# Altium footprint library Molex FFC - FPC Connectors (SMT).PcbLib: 638 footprints (part 37 of 40)
Each footprint in its own frame and in the unit in brackets; x right, y up, seen from the top. Pads: shape width x height; smd on the part's side, far side on the other; paste and mask are expansions set on the pad; w line width, h text height; cw(c..) or ccw(c..) is an arc to the next point about the centre after c.
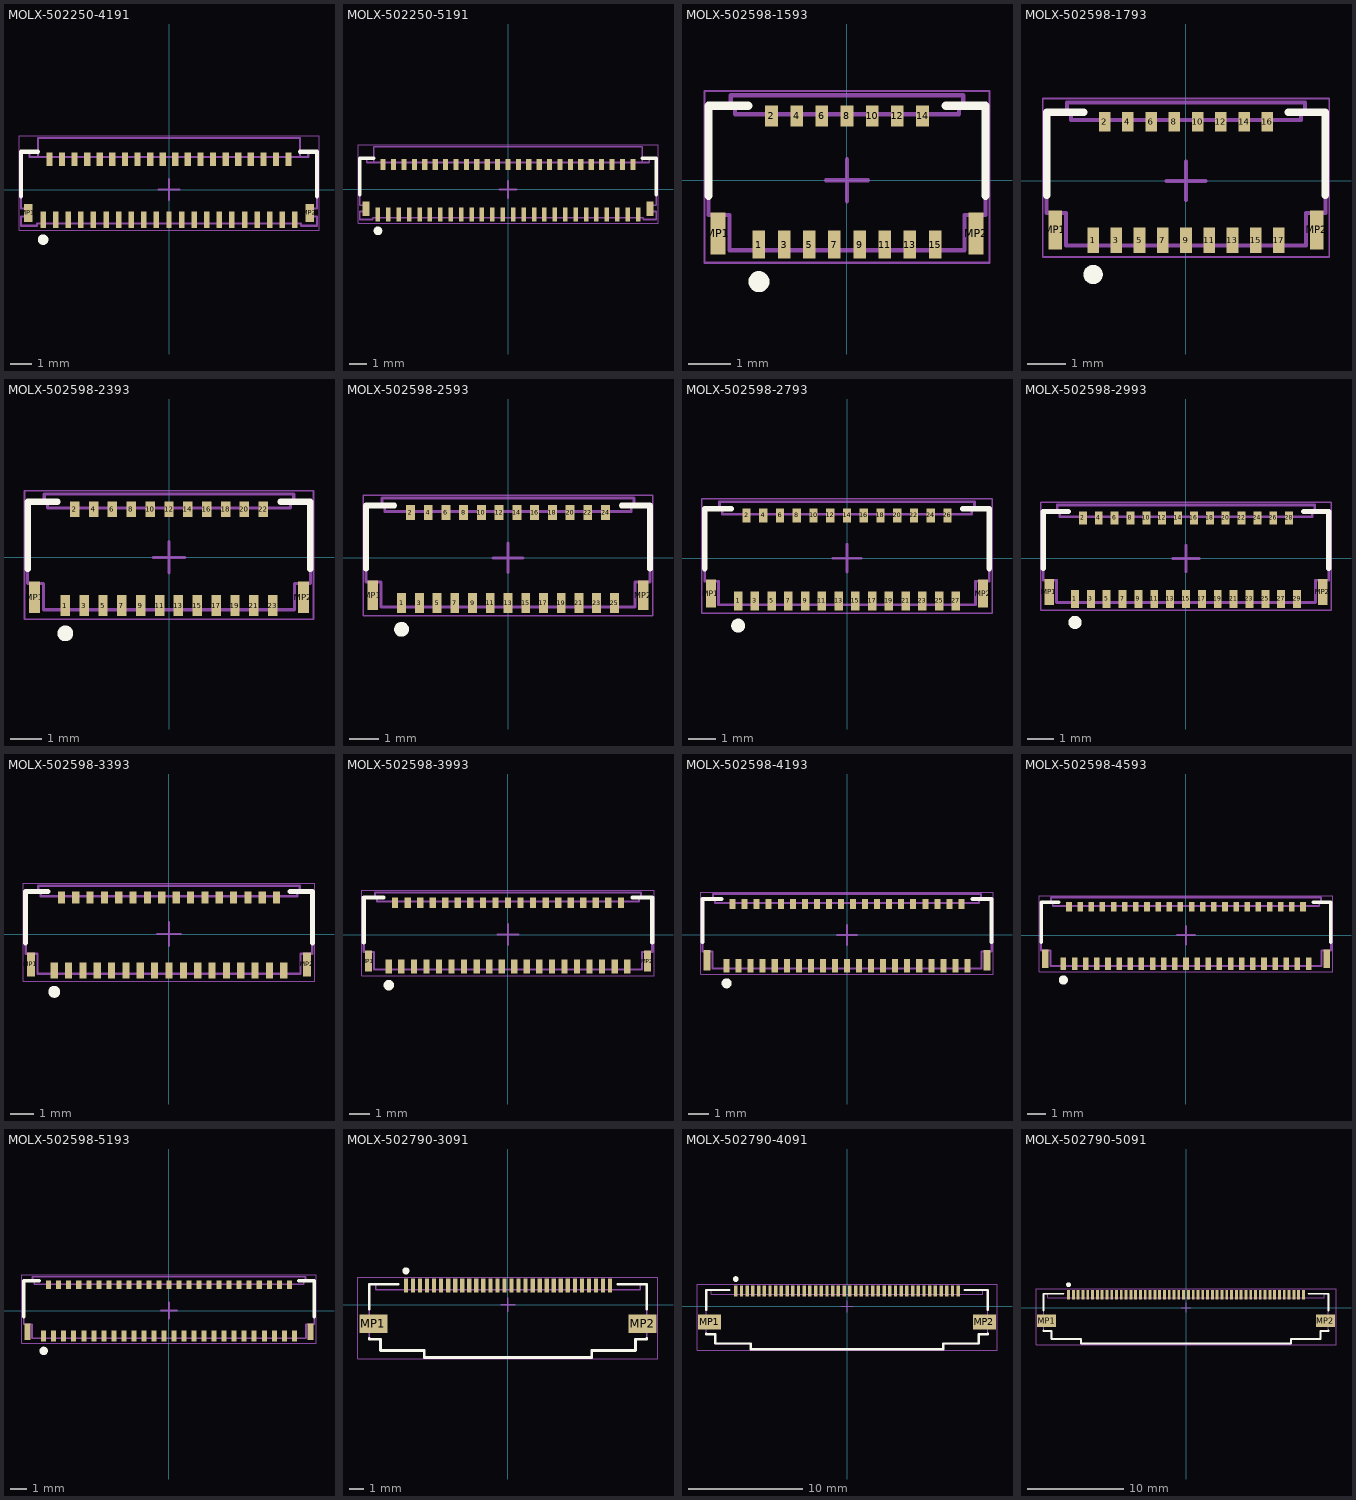
[diagram p36: the footprints below, top view; thin cyan lines are the x and y axes]

## MOLX-502250-4191 [mm] "FPC Connector, 41-Leads, Right Angle, Pitch 0.3 mm, Mated Height 0.9 mm, SMT"
height 0.912
pads (43):
  rect 0.26x0.8 smd: 1(-6,-1.438) 3(-5.4,-1.438) 5(-4.8,-1.438) 7(-4.2,-1.438) 9(-3.6,-1.438) 11(-3,-1.438) 13(-2.4,-1.438) 15(-1.8,-1.438) 17(-1.2,-1.438) 19(-0.6,-1.438) 21(0,-1.438) 23(0.6,-1.438) 25(1.2,-1.438) 27(1.8,-1.438) 29(2.4,-1.438) 31(3,-1.438) 33(3.6,-1.438) 35(4.2,-1.438) 37(4.8,-1.438) 39(5.4,-1.438) 41(6,-1.438)
  rect 0.3x0.65 smd: 2(-5.7,1.438) 4(-5.1,1.438) 6(-4.5,1.438) 8(-3.9,1.438) 10(-3.3,1.438) 12(-2.7,1.438) 14(-2.1,1.438) 16(-1.5,1.438) 18(-0.9,1.438) 20(-0.3,1.438) 22(0.3,1.438) 24(0.9,1.438) 26(1.5,1.438) 28(2.1,1.438) 30(2.7,1.438) 32(3.3,1.438) 34(3.9,1.438) 36(4.5,1.438) 38(5.1,1.438) 40(5.7,1.438)
  rect 0.4x0.85 smd: MP1(-6.7,-1.112) MP2(6.7,-1.112)
Top Overlay:
  circle w0.25: c-6,-2.388 r0.125
  lines w0.2: -7.05,-0.317 -7.05,1.803 -6.248,1.803 ; 6.248,1.803 7.05,1.803 7.05,-0.317
Mechanical 13:
  lines w0.1: -6.24,1.56 -6.24,2.463 ; -6.24,1.803 -6.24,2.463 ; -4.2,-1.627 4.2,-1.627 ; -6.3,-1.727 -6.3,-1.727 ; -6.3,-1.727 -6.3,-1.627 6.3,-1.627 6.3,-1.727 7.05,-1.727 7.05,-1.277 6.77,-1.277 6.77,-0.912 7.05,-0.912 7.05,1.803 6.749,1.803 6.75,1.74 6.639,1.74 6.64,1.56 6.24,1.56 ; -6.3,-1.727 -7.05,-1.727 -7.05,-1.277 -6.77,-1.277 -6.77,-0.912 -7.05,-0.912 -7.05,1.803 -6.75,1.803 -6.75,1.74 -6.64,1.74 -6.64,1.56 6.24,1.56 ; -6.24,2.463 6.24,2.463 6.24,1.56
Mechanical 15:
  lines w0.05: -7.15,-1.937 -7.15,2.563 7.15,2.563 7.15,-1.937 -7.15,-1.937
  lines w0.1: -0.5,0 0.5,0 ; 0,-0.5 0,0.5
3D body: height 0.25, standoff 0, extent -7.05,-1.727 7.05,2.463

## MOLX-502250-5191 [mm] "FPC Connector, 51-Leads, Right Angle, Pitch 0.3 mm, Mated Height 0.9 mm, SMT"
height 0.912
pads (53):
  rect 0.26x0.8 smd: 1(-7.5,-1.437) 3(-6.9,-1.437) 5(-6.3,-1.437) 7(-5.7,-1.437) 9(-5.1,-1.437) 11(-4.5,-1.437) 13(-3.9,-1.437) 15(-3.3,-1.437) 17(-2.7,-1.437) 19(-2.1,-1.437) 21(-1.5,-1.437) 23(-0.9,-1.437) 25(-0.3,-1.437) 27(0.3,-1.437) 29(0.9,-1.437) 31(1.5,-1.437) 33(2.1,-1.437) 35(2.7,-1.437) 37(3.3,-1.437) 39(3.9,-1.437) 41(4.5,-1.437) 43(5.1,-1.437) 45(5.7,-1.437) 47(6.3,-1.437) 49(6.9,-1.437) 51(7.5,-1.437)
  rect 0.3x0.65 smd: 2(-7.2,1.438) 4(-6.6,1.438) 6(-6,1.438) 8(-5.4,1.438) 10(-4.8,1.438) 12(-4.2,1.438) 14(-3.6,1.438) 16(-3,1.438) 18(-2.4,1.438) 20(-1.8,1.438) 22(-1.2,1.438) 24(-0.6,1.438) 26(0,1.438) 28(0.6,1.438) 30(1.2,1.438) 32(1.8,1.438) 34(2.4,1.438) 36(3,1.438) 38(3.6,1.438) 40(4.2,1.438) 42(4.8,1.438) 44(5.4,1.438) 46(6,1.438) 48(6.6,1.438) 50(7.2,1.438)
  rect 0.4x0.85 smd: MP1(-8.2,-1.112) MP2(8.2,-1.112)
Top Overlay:
  circle w0.25: c-7.5,-2.387 r0.125
  lines w0.2: -8.55,-0.317 -8.55,1.803 -7.748,1.803 ; 7.748,1.803 8.55,1.803 8.55,-0.316
Mechanical 13:
  lines w0.1: -8.14,1.739 -8.14,1.56 7.74,1.559 ; -8.14,1.74 -8.25,1.74 -8.25,1.803 -8.55,1.803 -8.55,-0.912 -8.26,-0.912 -8.26,-1.277 -8.55,-1.277 -8.55,-1.727 -7.8,-1.727 -7.8,-1.628 7.8,-1.628 7.8,-1.727 8.55,-1.727 8.55,-1.277 8.26,-1.277 8.26,-0.912 8.55,-0.912 8.55,1.803 8.249,1.803 8.25,1.74 8.139,1.74 ; -7.74,1.803 -7.74,2.463 7.74,2.463 7.74,1.559 ; -7.74,1.559 -7.74,2.463 ; 8.14,1.739 8.14,1.56 7.74,1.559
Mechanical 15:
  lines w0.05: -8.65,-1.937 -8.65,2.563 8.65,2.563 8.65,-1.937 -8.65,-1.937
  lines w0.1: -0.5,0 0.5,0 ; 0,-0.5 0,0.5
3D body: height 0.25, standoff 0, extent -8.55,-1.727 8.55,2.463

## MOLX-502598-1593 [mm] "FPC Connector, 15-Leads, Right Angle, Pitch 0.3 mm, Mated Height 1.15 mm, SMT"
height 1.162
pads (17):
  rect 0.3x0.67 smd: 1(-2.1,-1.532) 3(-1.5,-1.532) 5(-0.9,-1.532) 7(-0.3,-1.532) 9(0.3,-1.532) 11(0.9,-1.532) 13(1.5,-1.532) 15(2.1,-1.532)
  rect 0.3x0.5 smd: 2(-1.8,1.533) 4(-1.2,1.533) 6(-0.6,1.533) 8(0,1.533) 10(0.6,1.533) 12(1.2,1.533) 14(1.8,1.533)
  rect 0.35x1 smd: MP1(-3.075,-1.267) MP2(3.075,-1.267)
Top Overlay:
  circle w0.25: c-2.1,-2.417 r0.125
  lines w0.2: -3.3,-0.371 -3.3,1.775 -2.35,1.775 ; 2.35,1.775 3.3,1.775 3.3,-0.371
Mechanical 13:
  lines w0.1: -2.77,1.775 -2.77,2.025 2.77,2.025 2.77,1.775 ; -3.3,-0.825 -3.3,1.775 -2.67,1.775 -2.67,1.575 2.67,1.575 2.67,1.775 3.3,1.775 3.3,-0.825 2.8,-0.825 2.8,-1.667 -2.8,-1.667 -2.8,-0.825 -3.3,-0.825
Mechanical 15:
  lines w0.05: -3.4,-1.967 3.4,-1.967 3.4,2.125 -3.4,2.125 -3.4,-1.967
  lines w0.1: -0.5,0 0.5,0 ; 0,-0.5 0,0.5
3D body: height 0.25, standoff 0, extent -3.3,-1.775 3.3,2.025

## MOLX-502598-1793 [mm] "FPC Connector, 17-Leads, Right Angle, Pitch 0.3 mm, Mated Height 1.15 mm, SMT"
height 1.162
pads (19):
  rect 0.3x0.67 smd: 1(-2.4,-1.532) 3(-1.8,-1.532) 5(-1.2,-1.532) 7(-0.6,-1.532) 9(0,-1.532) 11(0.6,-1.532) 13(1.2,-1.532) 15(1.8,-1.532) 17(2.4,-1.532)
  rect 0.3x0.5 smd: 2(-2.1,1.533) 4(-1.5,1.533) 6(-0.9,1.533) 8(-0.3,1.533) 10(0.3,1.533) 12(0.9,1.533) 14(1.5,1.533) 16(2.1,1.533)
  rect 0.35x1 smd: MP1(-3.375,-1.267) MP2(3.375,-1.267)
Top Overlay:
  circle w0.25: c-2.4,-2.417 r0.125
  lines w0.2: -3.6,-0.371 -3.6,1.775 -2.65,1.775 ; 2.65,1.775 3.6,1.775 3.6,-0.371
Mechanical 13:
  lines w0.1: -3.1,-1.667 3.1,-1.667 ; -3.1,-1.667 -3.1,-0.825 -3.6,-0.825 -3.6,1.775 -2.97,1.775 -2.97,1.575 2.97,1.575 2.97,1.775 3.6,1.775 3.6,-0.825 3.1,-0.825 3.1,-1.667 ; -3.07,1.775 -3.07,2.025 3.07,2.025 3.07,1.775
Mechanical 15:
  lines w0.05: -3.7,-1.967 -3.7,2.125 3.7,2.125 3.7,-1.967 -3.7,-1.967
  lines w0.1: -0.5,0 0.5,0 ; 0,-0.5 0,0.5
3D body: height 0.25, standoff 0, extent -3.6,-1.775 3.6,2.025

## MOLX-502598-2393 [mm] "FPC Connector, 23-Leads, Right Angle, Pitch 0.3 mm, Mated Height 1.15 mm, SMT"
height 1.162
pads (25):
  rect 0.3x0.67 smd: 1(-3.3,-1.532) 3(-2.7,-1.532) 5(-2.1,-1.532) 7(-1.5,-1.532) 9(-0.9,-1.532) 11(-0.3,-1.532) 13(0.3,-1.532) 15(0.9,-1.532) 17(1.5,-1.532) 19(2.1,-1.532) 21(2.7,-1.532) 23(3.3,-1.532)
  rect 0.3x0.5 smd: 2(-3,1.533) 4(-2.4,1.533) 6(-1.8,1.533) 8(-1.2,1.533) 10(-0.6,1.533) 12(0,1.533) 14(0.6,1.533) 16(1.2,1.533) 18(1.8,1.533) 20(2.4,1.533) 22(3,1.533)
  rect 0.35x1 smd: MP1(-4.275,-1.267) MP2(4.275,-1.267)
Top Overlay:
  circle w0.25: c-3.3,-2.417 r0.125
  lines w0.2: -4.5,-0.37 -4.5,1.775 -3.55,1.775 ; 3.55,1.775 4.5,1.775 4.5,-0.37
Mechanical 13:
  lines w0.1: -3.97,1.775 -3.97,2.025 3.97,2.025 3.97,1.775 ; -4.5,-0.825 -4,-0.825 -4,-1.667 4,-1.667 4,-0.825 4.5,-0.825 4.5,1.775 3.87,1.775 3.87,1.575 -3.87,1.575 -3.87,1.775 -4.5,1.775 -4.5,-0.825
Mechanical 15:
  lines w0.05: -4.6,-1.967 4.6,-1.967 4.6,2.125 -4.6,2.125 -4.6,-1.967
  lines w0.1: -0.5,0 0.5,0 ; 0,-0.5 0,0.5
3D body: height 0.25, standoff 0, extent -4.5,-1.775 4.5,2.025

## MOLX-502598-2593 [mm] "FPC Connector, 25-Leads, Right Angle, Pitch 0.3 mm, Mated Height 1.15 mm, SMT"
height 1.162
pads (27):
  rect 0.3x0.67 smd: 1(-3.6,-1.532) 3(-3,-1.532) 5(-2.4,-1.532) 7(-1.8,-1.532) 9(-1.2,-1.532) 11(-0.6,-1.532) 13(0,-1.532) 15(0.6,-1.532) 17(1.2,-1.532) 19(1.8,-1.532) 21(2.4,-1.532) 23(3,-1.532) 25(3.6,-1.532)
  rect 0.3x0.5 smd: 2(-3.3,1.533) 4(-2.7,1.533) 6(-2.1,1.533) 8(-1.5,1.533) 10(-0.9,1.533) 12(-0.3,1.533) 14(0.3,1.533) 16(0.9,1.533) 18(1.5,1.533) 20(2.1,1.533) 22(2.7,1.533) 24(3.3,1.533)
  rect 0.35x1 smd: MP1(-4.575,-1.267) MP2(4.575,-1.267)
Top Overlay:
  circle w0.25: c-3.6,-2.417 r0.125
  lines w0.2: -4.8,-0.37 -4.8,1.775 -3.85,1.775 ; 3.85,1.775 4.8,1.775 4.8,-0.37
Mechanical 13:
  lines w0.1: -4.27,1.775 -4.27,2.025 4.27,2.025 4.27,1.77 ; -4.17,1.775 -4.17,1.575 4.17,1.575 4.17,1.775 4.8,1.775 ; -4.17,1.775 -4.8,1.775 -4.8,-0.825 -4.3,-0.825 -4.3,-1.667 4.3,-1.667 4.3,-0.825 4.8,-0.825 ; 4.8,-0.825 4.8,1.75 ; -4.275,1.775 -4.27,1.78 -4.275,1.775
Mechanical 15:
  lines w0.05: -4.9,-1.967 -4.9,2.125 4.9,2.125 4.9,-1.967 -4.9,-1.967
  lines w0.1: -0.5,0 0.5,0 ; 0,-0.5 0,0.5
3D body: height 0.25, standoff 0, extent -4.8,-1.775 4.8,2.025

## MOLX-502598-2793 [mm] "FPC Connector, 27-Leads, Right Angle, Pitch 0.3 mm, Mated Height 1.15 mm, SMT"
height 1.162
pads (29):
  rect 0.3x0.67 smd: 1(-3.9,-1.532) 3(-3.3,-1.532) 5(-2.7,-1.532) 7(-2.1,-1.532) 9(-1.5,-1.532) 11(-0.9,-1.532) 13(-0.3,-1.532) 15(0.3,-1.532) 17(0.9,-1.532) 19(1.5,-1.532) 21(2.1,-1.532) 23(2.7,-1.532) 25(3.3,-1.532) 27(3.9,-1.532)
  rect 0.3x0.5 smd: 2(-3.6,1.533) 4(-3,1.533) 6(-2.4,1.533) 8(-1.8,1.533) 10(-1.2,1.533) 12(-0.6,1.533) 14(0,1.533) 16(0.6,1.533) 18(1.2,1.533) 20(1.8,1.533) 22(2.4,1.533) 24(3,1.533) 26(3.6,1.533)
  rect 0.35x1 smd: MP1(-4.875,-1.267) MP2(4.875,-1.267)
Top Overlay:
  circle w0.25: c-3.9,-2.417 r0.125
  lines w0.2: -5.1,-0.37 -5.1,1.775 -4.15,1.775 ; 4.15,1.775 5.1,1.775 5.1,-0.37
Mechanical 13:
  lines w0.1: -4.57,1.775 -4.57,2.025 4.57,2.025 4.57,1.775 ; -5.1,-0.825 -4.6,-0.825 -4.6,-1.667 4.6,-1.667 4.6,-0.825 5.1,-0.825 5.1,1.775 4.47,1.775 4.47,1.575 -4.47,1.575 -4.47,1.775 -5.1,1.775 -5.1,-0.825 ; -4.575,1.775 -4.575,1.775
Mechanical 15:
  lines w0.05: -5.2,-1.967 -5.2,2.125 5.2,2.125 5.2,-1.967 -5.2,-1.967
  lines w0.1: -0.5,0 0.5,0 ; 0,-0.5 0,0.5
3D body: height 0.25, standoff 0, extent -5.1,-1.775 5.1,2.025

## MOLX-502598-2993 [mm] "FPC Connector, 29-Leads, Right Angle, Pitch 0.3 mm, Mated Height 1.15 mm, SMT"
height 1.162
pads (31):
  rect 0.3x0.67 smd: 1(-4.2,-1.532) 3(-3.6,-1.532) 5(-3,-1.532) 7(-2.4,-1.532) 9(-1.8,-1.532) 11(-1.2,-1.532) 13(-0.6,-1.532) 15(0,-1.532) 17(0.6,-1.532) 19(1.2,-1.532) 21(1.8,-1.532) 23(2.4,-1.532) 25(3,-1.532) 27(3.6,-1.532) 29(4.2,-1.532)
  rect 0.3x0.5 smd: 2(-3.9,1.533) 4(-3.3,1.533) 6(-2.7,1.533) 8(-2.1,1.533) 10(-1.5,1.533) 12(-0.9,1.533) 14(-0.3,1.533) 16(0.3,1.533) 18(0.9,1.533) 20(1.5,1.533) 22(2.1,1.533) 24(2.7,1.533) 26(3.3,1.533) 28(3.9,1.533)
  rect 0.35x1 smd: MP1(-5.175,-1.267) MP2(5.175,-1.267)
Top Overlay:
  circle w0.25: c-4.2,-2.417 r0.125
  lines w0.2: -5.4,-0.37 -5.4,1.775 -4.45,1.775 ; 4.45,1.775 5.4,1.775 5.4,-0.37
Mechanical 13:
  lines w0.1: -4.87,1.775 -4.87,2.025 4.87,2.025 4.87,1.775 ; 4.77,1.775 5.4,1.775 ; 4.77,1.775 4.77,1.575 -4.77,1.575 -4.77,1.775 -5.4,1.775 -5.4,-0.825 -4.9,-0.825 -4.9,-1.667 4.9,-1.667 4.9,-0.825 5.4,-0.825 5.4,1.775
Mechanical 15:
  lines w0.05: -5.5,-1.967 5.5,-1.967 5.5,2.125 -5.5,2.125 -5.5,-1.967
  lines w0.1: -0.5,0 0.5,0 ; 0,-0.5 0,0.5
3D body: height 0.25, standoff 0, extent -5.4,-1.774 5.4,2.026

## MOLX-502598-3393 [mm] "FPC Connector, 33-Leads, Right Angle, Pitch 0.3 mm, Mated Height 1.15 mm, SMT"
height 1.162
pads (35):
  rect 0.3x0.67 smd: 1(-4.8,-1.532) 3(-4.2,-1.532) 5(-3.6,-1.532) 7(-3,-1.532) 9(-2.4,-1.532) 11(-1.8,-1.532) 13(-1.2,-1.532) 15(-0.6,-1.532) 17(0,-1.532) 19(0.6,-1.532) 21(1.2,-1.532) 23(1.8,-1.532) 25(2.4,-1.532) 27(3,-1.532) 29(3.6,-1.532) 31(4.2,-1.532) 33(4.8,-1.532)
  rect 0.3x0.5 smd: 2(-4.5,1.533) 4(-3.9,1.533) 6(-3.3,1.533) 8(-2.7,1.533) 10(-2.1,1.533) 12(-1.5,1.533) 14(-0.9,1.533) 16(-0.3,1.533) 18(0.3,1.533) 20(0.9,1.533) 22(1.5,1.533) 24(2.1,1.533) 26(2.7,1.533) 28(3.3,1.533) 30(3.9,1.533) 32(4.5,1.533)
  rect 0.35x1 smd: MP1(-5.775,-1.267) MP2(5.775,-1.267)
Top Overlay:
  circle w0.25: c-4.8,-2.417 r0.125
  lines w0.2: -6,-0.37 -6,1.775 -5.05,1.775 ; 5.05,1.775 6,1.775 6,-0.37
Mechanical 13:
  lines w0.1: -5.47,1.775 -5.47,2.025 5.47,2.025 5.47,1.775 ; -6,-0.825 -5.5,-0.825 -5.5,-1.667 5.5,-1.667 5.5,-0.825 6,-0.825 6,1.775 5.37,1.775 5.37,1.575 -5.37,1.575 -5.37,1.775 -6,1.775 -6,-0.825
Mechanical 15:
  lines w0.05: -6.1,-1.967 6.1,-1.967 6.1,2.125 -6.1,2.125 -6.1,-1.967
  lines w0.1: -0.5,0 0.5,0 ; 0,-0.5 0,0.5
3D body: height 0.25, standoff 0, extent -6,-1.775 6,2.025

## MOLX-502598-3993 [mm] "FPC Connector, 39-Leads, Right Angle, Pitch 0.3 mm, Mated Height 1.15 mm, SMT"
height 1.162
pads (41):
  rect 0.3x0.67 smd: 1(-5.7,-1.532) 3(-5.1,-1.532) 5(-4.5,-1.532) 7(-3.9,-1.532) 9(-3.3,-1.532) 11(-2.7,-1.532) 13(-2.1,-1.532) 15(-1.5,-1.532) 17(-0.9,-1.532) 19(-0.3,-1.532) 21(0.3,-1.532) 23(0.9,-1.532) 25(1.5,-1.532) 27(2.1,-1.532) 29(2.7,-1.532) 31(3.3,-1.532) 33(3.9,-1.532) 35(4.5,-1.532) 37(5.1,-1.532) 39(5.7,-1.532)
  rect 0.3x0.5 smd: 2(-5.4,1.533) 4(-4.8,1.533) 6(-4.2,1.533) 8(-3.6,1.533) 10(-3,1.533) 12(-2.4,1.533) 14(-1.8,1.533) 16(-1.2,1.533) 18(-0.6,1.533) 20(0,1.533) 22(0.6,1.533) 24(1.2,1.533) 26(1.8,1.533) 28(2.4,1.533) 30(3,1.533) 32(3.6,1.533) 34(4.2,1.533) 36(4.8,1.533) 38(5.4,1.533)
  rect 0.35x1 smd: MP1(-6.675,-1.267) MP2(6.675,-1.267)
Top Overlay:
  circle w0.25: c-5.7,-2.417 r0.125
  lines w0.2: -6.9,-0.37 -6.9,1.775 -5.95,1.775 ; 5.95,1.775 6.9,1.775 6.9,-0.37
Mechanical 13:
  lines w0.1: -6.37,1.775 -6.37,2.025 6.37,2.025 6.37,1.775 ; 6.27,1.775 6.9,1.775 ; 6.27,1.775 6.27,1.575 -6.27,1.575 -6.27,1.775 -6.9,1.775 -6.9,-0.825 -6.4,-0.825 -6.4,-1.667 6.4,-1.667 6.4,-0.825 6.9,-0.825 6.9,1.775
Mechanical 15:
  lines w0.05: -7,-1.967 7,-1.967 7,2.125 -7,2.125 -7,-1.967
  lines w0.1: -0.5,0 0.5,0 ; 0,-0.5 0,0.5
3D body: height 0.25, standoff 0, extent -6.9,-1.775 6.9,2.025

## MOLX-502598-4193 [mm] "FPC Connector, 41-Leads, Right Angle, Pitch 0.3 mm, Mated Height 1.15 mm, SMT"
height 1.162
pads (43):
  rect 0.3x0.67 smd: 1(-6,-1.532) 3(-5.4,-1.532) 5(-4.8,-1.532) 7(-4.2,-1.532) 9(-3.6,-1.532) 11(-3,-1.532) 13(-2.4,-1.532) 15(-1.8,-1.532) 17(-1.2,-1.532) 19(-0.6,-1.532) 21(0,-1.532) 23(0.6,-1.532) 25(1.2,-1.532) 27(1.8,-1.532) 29(2.4,-1.532) 31(3,-1.532) 33(3.6,-1.532) 35(4.2,-1.532) 37(4.8,-1.532) 39(5.4,-1.532) 41(6,-1.532)
  rect 0.3x0.5 smd: 2(-5.7,1.533) 4(-5.1,1.533) 6(-4.5,1.533) 8(-3.9,1.533) 10(-3.3,1.533) 12(-2.7,1.533) 14(-2.1,1.533) 16(-1.5,1.533) 18(-0.9,1.533) 20(-0.3,1.533) 22(0.3,1.533) 24(0.9,1.533) 26(1.5,1.533) 28(2.1,1.533) 30(2.7,1.533) 32(3.3,1.533) 34(3.9,1.533) 36(4.5,1.533) 38(5.1,1.533) 40(5.7,1.533)
  rect 0.35x1 smd: MP1(-6.975,-1.267) MP2(6.975,-1.267)
Top Overlay:
  circle w0.25: c-6,-2.417 r0.125
  lines w0.2: -7.2,-0.37 -7.2,1.775 -6.25,1.775 ; 6.25,1.775 7.2,1.775 7.2,-0.37
Mechanical 13:
  lines w0.1: -6.67,1.775 -6.67,2.025 6.67,2.025 6.67,1.775 ; -7.2,-0.825 -6.7,-0.825 -6.7,-1.667 6.7,-1.667 6.7,-0.825 7.2,-0.825 7.2,1.775 6.57,1.775 6.57,1.575 -6.57,1.575 -6.57,1.775 -7.2,1.775 -7.2,-0.825
Mechanical 15:
  lines w0.05: -7.3,-1.967 -7.3,2.125 7.3,2.125 7.3,-1.967 -7.3,-1.967
  lines w0.1: -0.5,0 0.5,0 ; 0,-0.5 0,0.5
3D body: height 0.25, standoff 0, extent -7.2,-1.775 7.2,2.025

## MOLX-502598-4593 [mm] "FPC Connector, 45-Leads, Right Angle, Pitch 0.3 mm, Mated Height 1.15 mm, SMT"
height 1.162
pads (47):
  rect 0.3x0.67 smd: 1(-6.6,-1.532) 3(-6,-1.532) 5(-5.4,-1.532) 7(-4.8,-1.532) 9(-4.2,-1.532) 11(-3.6,-1.532) 13(-3,-1.532) 15(-2.4,-1.532) 17(-1.8,-1.532) 19(-1.2,-1.532) 21(-0.6,-1.532) 23(0,-1.532) 25(0.6,-1.532) 27(1.2,-1.532) 29(1.8,-1.532) 31(2.4,-1.532) 33(3,-1.532) 35(3.6,-1.532) 37(4.2,-1.532) 39(4.8,-1.532) 41(5.4,-1.532) 43(6,-1.532) 45(6.6,-1.532)
  rect 0.3x0.5 smd: 2(-6.3,1.533) 4(-5.7,1.533) 6(-5.1,1.533) 8(-4.5,1.533) 10(-3.9,1.533) 12(-3.3,1.533) 14(-2.7,1.533) 16(-2.1,1.533) 18(-1.5,1.533) 20(-0.9,1.533) 22(-0.3,1.533) 24(0.3,1.533) 26(0.9,1.533) 28(1.5,1.533) 30(2.1,1.533) 32(2.7,1.533) 34(3.3,1.533) 36(3.9,1.533) 38(4.5,1.533) 40(5.1,1.533) 42(5.7,1.533) 44(6.3,1.533)
  rect 0.35x1 smd: MP1(-7.575,-1.267) MP2(7.575,-1.267)
Top Overlay:
  circle w0.25: c-6.6,-2.417 r0.125
  lines w0.2: -7.8,-0.37 -7.8,1.775 -6.85,1.775 ; 6.85,1.775 7.8,1.775 7.8,-0.37
Mechanical 13:
  lines w0.1: -7.27,1.775 -7.27,2.025 7.27,2.025 7.27,1.775 ; -7.8,-0.825 -7.8,1.775 -7.17,1.775 -7.17,1.575 7.17,1.575 7.17,1.775 7.8,1.775 7.8,-0.825 7.3,-0.825 7.3,-1.667 -7.3,-1.667 -7.3,-0.825 -7.8,-0.825
Mechanical 15:
  lines w0.05: -7.9,-1.967 -7.9,2.125 7.9,2.125 7.9,-1.967 -7.9,-1.967
  lines w0.1: -0.5,0 0.5,0 ; 0,-0.5 0,0.5
3D body: height 0.25, standoff 0, extent -7.8,-1.775 7.8,2.025

## MOLX-502598-5193 [mm] "FPC Connector, 51-Leads, Right Angle, Pitch 0.3 mm, Mated Height 1.15 mm, SMT"
height 1.162
pads (53):
  rect 0.3x0.67 smd: 1(-7.5,-1.532) 3(-6.9,-1.532) 5(-6.3,-1.532) 7(-5.7,-1.532) 9(-5.1,-1.532) 11(-4.5,-1.532) 13(-3.9,-1.532) 15(-3.3,-1.532) 17(-2.7,-1.532) 19(-2.1,-1.532) 21(-1.5,-1.532) 23(-0.9,-1.532) 25(-0.3,-1.532) 27(0.3,-1.532) 29(0.9,-1.532) 31(1.5,-1.532) 33(2.1,-1.532) 35(2.7,-1.532) 37(3.3,-1.532) 39(3.9,-1.532) 41(4.5,-1.532) 43(5.1,-1.532) 45(5.7,-1.532) 47(6.3,-1.532) 49(6.9,-1.532) 51(7.5,-1.532)
  rect 0.3x0.5 smd: 2(-7.2,1.533) 4(-6.6,1.533) 6(-6,1.533) 8(-5.4,1.533) 10(-4.8,1.533) 12(-4.2,1.533) 14(-3.6,1.533) 16(-3,1.533) 18(-2.4,1.533) 20(-1.8,1.533) 22(-1.2,1.533) 24(-0.6,1.533) 26(0,1.533) 28(0.6,1.533) 30(1.2,1.533) 32(1.8,1.533) 34(2.4,1.533) 36(3,1.533) 38(3.6,1.533) 40(4.2,1.533) 42(4.8,1.533) 44(5.4,1.533) 46(6,1.533) 48(6.6,1.533) 50(7.2,1.533)
  rect 0.35x1 smd: MP1(-8.475,-1.267) MP2(8.475,-1.267)
Top Overlay:
  circle w0.25: c-7.5,-2.417 r0.125
  lines w0.2: -8.7,-0.37 -8.7,1.775 -7.75,1.775 ; 7.75,1.775 8.7,1.775 8.7,-0.37
Mechanical 13:
  lines w0.1: -8.17,1.775 -8.17,2.025 8.17,2.025 8.17,1.775 ; 8.07,1.775 8.7,1.775 8.7,-0.825 8.2,-0.825 8.2,-1.667 -8.2,-1.667 -8.2,-0.825 -8.7,-0.825 -8.7,1.775 -8.07,1.775 -8.07,1.575 8.07,1.575 8.07,1.775
Mechanical 15:
  lines w0.05: -8.8,-1.967 -8.8,2.125 8.8,2.125 8.8,-1.967 -8.8,-1.967
  lines w0.1: -0.5,0 0.5,0 ; 0,-0.5 0,0.5
3D body: height 0.25, standoff 0, extent -8.7,-1.775 8.7,2.025

## MOLX-502790-3091 [mm] "FPC Connector, 30-Leads, Right Angle, Pitch 0.5 mm, Mated Height 2.5 mm, SMT"
height 2.512
pads (32):
  rect 0.3x1 smd: 1(-7.25,1.35) 2(-6.75,1.35) 3(-6.25,1.35) 4(-5.75,1.35) 5(-5.25,1.35) 6(-4.75,1.35) 7(-4.25,1.35) 8(-3.75,1.35) 9(-3.25,1.35) 10(-2.75,1.35) 11(-2.25,1.35) 12(-1.75,1.35) 13(-1.25,1.35) 14(-0.75,1.35) 15(-0.25,1.35) 16(0.25,1.35) 17(0.75,1.35) 18(1.25,1.35) 19(1.75,1.35) 20(2.25,1.35) 21(2.75,1.35) 22(3.25,1.35) 23(3.75,1.35) 24(4.25,1.35) 25(4.75,1.35) 26(5.25,1.35) 27(5.75,1.35) 28(6.25,1.35) 29(6.75,1.35) 30(7.25,1.35)
  rect 2x1.3 smd: MP1(-9.55,-1.35) MP2(9.55,-1.35)
Top Overlay:
  circle w0.25: c-7.25,2.4 r0.125
  lines w0.2: -9.85,-2.4 -9.85,-2.45 -9.05,-2.45 -9.05,-3.25 -5.95,-3.25 -5.95,-3.75 5.95,-3.75 5.95,-3.25 9.05,-3.25 9.05,-2.45 9.85,-2.45 9.85,-2.4 ; -9.85,-0.3 -9.85,1.45 -7.8,1.45 ; 7.8,1.45 9.85,1.45 9.85,-0.3
Mechanical 13:
  lines w0.1: -9.85,-2.45 -9.85,1.45 -9.4,1.45 -9.4,1.05 9.4,1.05 9.4,1.45 9.85,1.45 9.85,-2.45 9.05,-2.45 9.05,-3.25 5.95,-3.25 5.95,-3.75 -5.95,-3.75 -5.95,-3.25 -9.05,-3.25 -9.05,-2.45 -9.85,-2.45
Mechanical 15:
  lines w0.05: -10.65,-3.85 10.65,-3.85 10.65,1.95 -10.65,1.95 -10.65,-3.85
  lines w0.1: -0.5,0 0.5,0 ; 0,-0.5 0,0.5
3D body: height 0.25, standoff 0, extent -10.25,-3.75 10.25,1.55

## MOLX-502790-4091 [mm] "FPC Connector, 40-Leads, Right Angle, Pitch 0.5 mm, Mated Height 2.5 mm, SMT"
height 2.512
pads (42):
  rect 0.3x1 smd: 1(-9.75,1.35) 2(-9.25,1.35) 3(-8.75,1.35) 4(-8.25,1.35) 5(-7.75,1.35) 6(-7.25,1.35) 7(-6.75,1.35) 8(-6.25,1.35) 9(-5.75,1.35) 10(-5.25,1.35) 11(-4.75,1.35) 12(-4.25,1.35) 13(-3.75,1.35) 14(-3.25,1.35) 15(-2.75,1.35) 16(-2.25,1.35) 17(-1.75,1.35) 18(-1.25,1.35) 19(-0.75,1.35) 20(-0.25,1.35) 21(0.25,1.35) 22(0.75,1.35) 23(1.25,1.35) 24(1.75,1.35) 25(2.25,1.35) 26(2.75,1.35) 27(3.25,1.35) 28(3.75,1.35) 29(4.25,1.35) 30(4.75,1.35) 31(5.25,1.35) 32(5.75,1.35) 33(6.25,1.35) 34(6.75,1.35) 35(7.25,1.35) 36(7.75,1.35) 37(8.25,1.35) 38(8.75,1.35) 39(9.25,1.35) 40(9.75,1.35)
  rect 2x1.3 smd: MP1(-12.05,-1.35) MP2(12.05,-1.35)
Top Overlay:
  circle w0.25: c-9.75,2.4 r0.125
  lines w0.2: -12.35,-2.4 -12.35,-2.45 -11.55,-2.45 -11.55,-3.25 -8.45,-3.25 -8.45,-3.75 8.45,-3.75 8.45,-3.25 11.55,-3.25 11.55,-2.45 12.35,-2.45 12.35,-2.4 ; -12.35,-0.3 -12.35,1.45 -10.3,1.45 ; 10.3,1.45 12.35,1.45 12.35,-0.3
Mechanical 13:
  lines w0.1: -12.35,-2.45 -12.35,1.45 -11.9,1.45 -11.9,1.05 11.9,1.05 11.9,1.45 12.35,1.45 12.35,-2.45 11.55,-2.45 11.55,-3.25 8.45,-3.25 8.45,-3.75 -8.45,-3.75 -8.45,-3.25 -11.55,-3.25 -11.55,-2.45 -12.35,-2.45
Mechanical 15:
  lines w0.05: -13.15,-3.85 13.15,-3.85 13.15,1.95 -13.15,1.95 -13.15,-3.85
  lines w0.1: -0.5,0 0.5,0 ; 0,-0.5 0,0.5
3D body: height 0.25, standoff 0, extent -12.75,-3.75 12.75,1.55

## MOLX-502790-5091 [mm] "FPC Connector, 50-Leads, Right Angle, Pitch 0.5 mm, Mated Height 2.5 mm, SMT"
height 2.512
pads (52):
  rect 0.3x1 smd: 1(-12.25,1.35) 2(-11.75,1.35) 3(-11.25,1.35) 4(-10.75,1.35) 5(-10.25,1.35) 6(-9.75,1.35) 7(-9.25,1.35) 8(-8.75,1.35) 9(-8.25,1.35) 10(-7.75,1.35) 11(-7.25,1.35) 12(-6.75,1.35) 13(-6.25,1.35) 14(-5.75,1.35) 15(-5.25,1.35) 16(-4.75,1.35) 17(-4.25,1.35) 18(-3.75,1.35) 19(-3.25,1.35) 20(-2.75,1.35) 21(-2.25,1.35) 22(-1.75,1.35) 23(-1.25,1.35) 24(-0.75,1.35) 25(-0.25,1.35) 26(0.25,1.35) 27(0.75,1.35) 28(1.25,1.35) 29(1.75,1.35) 30(2.25,1.35) 31(2.75,1.35) 32(3.25,1.35) 33(3.75,1.35) 34(4.25,1.35) 35(4.75,1.35) 36(5.25,1.35) 37(5.75,1.35) 38(6.25,1.35) 39(6.75,1.35) 40(7.25,1.35) 41(7.75,1.35) 42(8.25,1.35) 43(8.75,1.35) 44(9.25,1.35) 45(9.75,1.35) 46(10.25,1.35) 47(10.75,1.35) 48(11.25,1.35) 49(11.75,1.35) 50(12.25,1.35)
  rect 2x1.3 smd: MP1(-14.55,-1.35) MP2(14.55,-1.35)
Top Overlay:
  circle w0.25: c-12.25,2.4 r0.125
  lines w0.2: -14.85,-2.4 -14.85,-2.45 -14.05,-2.45 -14.05,-3.25 -10.95,-3.25 -10.95,-3.75 10.95,-3.75 10.95,-3.25 14.05,-3.25 14.05,-2.45 14.85,-2.45 14.85,-2.4 ; -14.85,-0.3 -14.85,1.45 -12.8,1.45 ; 12.8,1.45 14.85,1.45 14.85,-0.3
Mechanical 13:
  lines w0.1: -14.85,-2.45 -14.05,-2.45 -14.05,-3.25 -10.95,-3.25 -10.95,-3.75 10.95,-3.75 10.95,-3.25 14.05,-3.25 14.05,-2.45 14.85,-2.45 14.85,1.45 14.4,1.45 14.4,1.05 -14.4,1.05 -14.4,1.45 -14.85,1.45 -14.85,-2.45
Mechanical 15:
  lines w0.05: -15.65,-3.85 15.65,-3.85 15.65,1.95 -15.65,1.95 -15.65,-3.85
  lines w0.1: -0.5,0 0.5,0 ; 0,-0.5 0,0.5
3D body: height 0.25, standoff 0, extent -15.25,-3.75 15.25,1.55